# Altium footprint library Transformers.PcbLib: 93 footprints (part 6 of 7) (continued)
## TVI-180 - ER38.1/16/25 [mm]
pads (12):
  oval 3.5x2 hole 1.5: 1(-20,10) 2(-20,6) 3(-20,2) 4(-20,-2) 5(-20,-6) 6(-20,-10)
  round 2.5 hole 1.5: 1(20.5,10) 2(20.5,6) 3(20.5,2) 4(20.5,-2) 5(20.5,-6.5) 6(20.5,-10)
Mechanical 2:
  circle w0.15: c0,0 r7.2
  lines w0.15: -22,-0.5 -22,12.103 -12.501,12.103 -11.15,12.103 ccw(c-11.15,12.771) -10.679,12.299 -10.562,12.416 cw(c0,0) 0.251,16.298 ; -22,0.5 -22,-12.103 -12.501,-12.103 -11.15,-12.103 cw(c-11.15,-12.771) -10.679,-12.299 -10.562,-12.416 ccw(c0,0) 0.251,-16.298 ; -0.251,-16.298 ccw(c0,0) 10.562,-12.415 10.679,-12.299 ; -0.251,16.298 cw(c0,0) 10.562,12.415 10.679,12.299 ; 22,-0.5 22,12.103 12.501,12.103 ; 22,0.5 22,-12.103 12.501,-12.103 ; 10.679,-12.299 cw(c11.15,-12.771) 11.15,-12.103 ; 10.679,-12.299 cw(c11.15,-12.771) 11.15,-12.103 ; 10.679,12.299 ccw(c11.15,12.771) 11.15,12.103 ; 10.679,12.299 ccw(c11.15,12.771) 11.15,12.103 ; 11.15,-12.103 12.501,-12.103 ; 11.15,-12.103 12.501,-12.103 ; 11.15,12.103 12.501,12.103 ; 11.15,12.103 12.501,12.103
Top Assembly:
  circle w0.15: c0,0 r7.2
  lines w0.15: -0.251,16.298 cw(c0,0) 10.561,12.416 10.678,12.299 ccw(c11.15,12.771) 11.15,12.103 12.5,12.103 ccw(c12.5,12.603) 13,12.603 13,19 ccw(c12.5,19) 12.5,19.5 -12.5,19.5 ccw(c-12.5,19) -13,19 -13,12.603 ccw(c-12.5,12.603) -12.5,12.103 -11.15,12.103 ccw(c-11.15,12.771) -10.679,12.299 -10.562,12.416 cw(c0,0) 0.251,16.298 ; -13,-19 ccw(c-12.5,-19) -12.5,-19.5 ; -13,-19 ccw(c-12.5,-19) -12.5,-19.5 ; -13,-19 -13,-12.603 ; -13,-19 -13,-12.603 ; -13,-12.603 cw(c-12.5,-12.603) -12.5,-12.103 ; -13,-12.603 cw(c-12.5,-12.603) -12.5,-12.103 ; -12.5,-19.5 12.5,-19.5 ; -12.5,-19.5 12.5,-19.5 ; -12.5,-12.103 -11.15,-12.103 ; -12.5,-12.103 -11.15,-12.103 ; -11.15,-12.103 cw(c-11.15,-12.771) -10.679,-12.299 ; -11.15,-12.103 cw(c-11.15,-12.771) -10.679,-12.299 ; -10.679,-12.299 -10.562,-12.416 ; -10.679,-12.299 -10.562,-12.416 ; -10.561,-12.416 ccw(c0,0) 0.251,-16.298 cw(c0,0) -10.561,-12.416 ; 10.561,-12.416 cw(c0,0) -0.251,-16.298 ccw(c0,0) 10.561,-12.416 ; 10.561,-12.416 10.678,-12.299 ; 10.561,-12.416 10.678,-12.299 ; 10.678,-12.299 cw(c11.15,-12.771) 11.15,-12.103 ; 10.678,-12.299 cw(c11.15,-12.771) 11.15,-12.103 ; 11.15,-12.103 12.5,-12.103 ; 11.15,-12.103 12.5,-12.103 ; 12.5,-19.5 ccw(c12.5,-19) 13,-19 ; 12.5,-19.5 ccw(c12.5,-19) 13,-19 ; 12.5,-12.103 cw(c12.5,-12.603) 13,-12.603 ; 12.5,-12.103 cw(c12.5,-12.603) 13,-12.603 ; 13,-19 13,-12.603 ; 13,-19 13,-12.603
3D body: height 13, standoff 3, extent -22,-0.1 22,16.3
3D body: height 13, standoff 3, extent -22,-16.3 22,0.1
3D body "ER38.1-16-25.STEP": height -1, standoff -9, extent -12.7,-19.05 12.7,19.05
3D body "ER38.1-16-25.STEP": height -9, standoff -17, extent -12.7,-19.05 12.7,19.05

## TVI-180 - ER38.1/16/25 - PRIM1 [mm]
pads (12):
  oval 3.5x2 hole 1.5: 1(-20,10) 2(-20,6) 3(-20,2) 4(-20,-2) 5(-20,-6) 6(-20,-10)
  round 2.5 hole 1.5: 1(20.5,10) 2(20.5,6) 3(20.5,2) 4(20.5,-2) 5(20.5,-6.5) 6(20.5,-10)
via -9.41,-0.8 diameter 0.8 hole 0.5
via -9.41,0 diameter 0.8 hole 0.5
via -9.41,0.8 diameter 0.8 hole 0.5
Top Layer:
  lines w1.3: -19.5,10 -9.875,10 ; -14.05,0.658 -14.05,0 ccw(c0,0) 0,-14.05 ccw(c0,0) 14.05,0 ccw(c0,0) -9.86,10.009 ; -14.049,0.659 cw(c-8.829,0.659) -11.382,5.212 ; -12.5,0.658 -12.5,0 ccw(c0,0) 0,-12.5 ccw(c0,0) 12.5,0 ccw(c0,0) -11.329,5.282 ; -12.499,0.659 cw(c-8.829,0.659) -10.265,4.036 ; -10.929,0.659 cw(c-8.829,0.659) -9.012,2.751 ; -10.927,0.716 ccw(c0,0) 0,-10.95 ccw(c0,0) 10.95,0 ccw(c0,0) -10.167,4.067 ; -9.382,0.586 ccw(c0,0) 0,-9.4 ccw(c0,0) 9.4,0 ccw(c0,0) -8.99,2.746
  text "1" at -18,11 h1.5
Bottom Layer:
  region: -9.3,0.4
  lines w1.3: -19.904,6 cw(c-19.869,1.73) -15.599,1.73 ; -15.599,1.776 -15.599,-0.659 ccw(c-8.829,-0.659) -12.591,-6.287 ; -14.05,-0.658 -14.05,0 cw(c0,0) 0,14.05 cw(c0,0) 14.05,0 cw(c0,0) -12.527,-6.363 ; -14.049,-0.659 ccw(c-8.829,-0.659) -11.382,-5.212 ; -12.499,-0.659 ccw(c-8.829,-0.659) -10.265,-4.036 ; -12.5,-0.658 -12.5,0 cw(c0,0) 0,12.5 cw(c0,0) 12.5,0 cw(c0,0) -11.329,-5.282 ; -10.929,-0.659 ccw(c-8.829,-0.659) -9.012,-2.751 ; -10.927,-0.716 cw(c0,0) 0,10.95 cw(c0,0) 10.95,0 cw(c0,0) -10.167,-4.067 ; -9.382,-0.586 cw(c0,0) 0,9.4 cw(c0,0) 9.4,0 cw(c0,0) -8.99,-2.746
Keep-Out Layer:
  drawing of 3 lines, arcs and shapes, not listed
Mechanical 2:
  circle w0.15: c0,0 r7.2
  lines w0.15: -22,-0.5 -22,12.103 -12.501,12.103 -11.15,12.103 ccw(c-11.15,12.771) -10.679,12.299 -10.562,12.416 cw(c0,0) 0.251,16.298 ; -22,0.5 -22,-12.103 -12.501,-12.103 -11.15,-12.103 cw(c-11.15,-12.771) -10.679,-12.299 -10.562,-12.416 ccw(c0,0) 0.251,-16.298 ; -0.251,-16.298 ccw(c0,0) 10.562,-12.415 10.679,-12.299 ; -0.251,16.298 cw(c0,0) 10.562,12.415 10.679,12.299 ; 22,-0.5 22,12.103 12.501,12.103 ; 22,0.5 22,-12.103 12.501,-12.103 ; 10.679,-12.299 cw(c11.15,-12.771) 11.15,-12.103 ; 10.679,-12.299 cw(c11.15,-12.771) 11.15,-12.103 ; 10.679,12.299 ccw(c11.15,12.771) 11.15,12.103 ; 10.679,12.299 ccw(c11.15,12.771) 11.15,12.103 ; 11.15,-12.103 12.501,-12.103 ; 11.15,-12.103 12.501,-12.103 ; 11.15,12.103 12.501,12.103 ; 11.15,12.103 12.501,12.103
Top Assembly:
  circle w0.15: c0,0 r7.2
  lines w0.15: -0.251,16.298 cw(c0,0) 10.561,12.416 10.678,12.299 ccw(c11.15,12.771) 11.15,12.103 12.5,12.103 ccw(c12.5,12.603) 13,12.603 13,19 ccw(c12.5,19) 12.5,19.5 -12.5,19.5 ccw(c-12.5,19) -13,19 -13,12.603 ccw(c-12.5,12.603) -12.5,12.103 -11.15,12.103 ccw(c-11.15,12.771) -10.679,12.299 -10.562,12.416 cw(c0,0) 0.251,16.298 ; -13,-19 ccw(c-12.5,-19) -12.5,-19.5 ; -13,-19 ccw(c-12.5,-19) -12.5,-19.5 ; -13,-19 -13,-12.603 ; -13,-19 -13,-12.603 ; -13,-12.603 cw(c-12.5,-12.603) -12.5,-12.103 ; -13,-12.603 cw(c-12.5,-12.603) -12.5,-12.103 ; -12.5,-19.5 12.5,-19.5 ; -12.5,-19.5 12.5,-19.5 ; -12.5,-12.103 -11.15,-12.103 ; -12.5,-12.103 -11.15,-12.103 ; -11.15,-12.103 cw(c-11.15,-12.771) -10.679,-12.299 ; -11.15,-12.103 cw(c-11.15,-12.771) -10.679,-12.299 ; -10.679,-12.299 -10.562,-12.416 ; -10.679,-12.299 -10.562,-12.416 ; -10.561,-12.416 ccw(c0,0) 0.251,-16.298 cw(c0,0) -10.561,-12.416 ; 10.561,-12.416 cw(c0,0) -0.251,-16.298 ccw(c0,0) 10.561,-12.416 ; 10.561,-12.416 10.678,-12.299 ; 10.561,-12.416 10.678,-12.299 ; 10.678,-12.299 cw(c11.15,-12.771) 11.15,-12.103 ; 10.678,-12.299 cw(c11.15,-12.771) 11.15,-12.103 ; 11.15,-12.103 12.5,-12.103 ; 11.15,-12.103 12.5,-12.103 ; 12.5,-19.5 ccw(c12.5,-19) 13,-19 ; 12.5,-19.5 ccw(c12.5,-19) 13,-19 ; 12.5,-12.103 cw(c12.5,-12.603) 13,-12.603 ; 12.5,-12.103 cw(c12.5,-12.603) 13,-12.603 ; 13,-19 13,-12.603 ; 13,-19 13,-12.603
3D body "ER38.1-16-25.STEP": height 5, standoff -3, extent -12.7,-19.05 12.7,19.05

## TVI-180 - ER38.1/16/25 - PRIM2 [mm]
pads (12):
  oval 3.5x2 hole 1.5: 1(-20,10) 2(-20,6) 3(-20,2) 4(-20,-2) 5(-20,-6) 6(-20,-10)
  round 2.5 hole 1.5: 1(20.5,10) 2(20.5,6) 3(20.5,2) 4(20.5,-2) 5(20.5,-6.5) 6(20.5,-10)
via -9.41,0.8 diameter 0.8 hole 0.5
via -9.41,0 diameter 0.8 hole 0.5
via -9.41,-0.8 diameter 0.8 hole 0.5
Top Layer:
  lines w1.3: -20.5,6 -20.194,6.306 -12.555,6.306 cw(c0,0) 14.05,0 cw(c0,0) 0,-14.05 cw(c0,0) -14.05,0 -14.05,0.658 ; -14.049,0.659 cw(c-8.829,0.659) -11.382,5.212 ; -12.5,0.658 -12.5,0 ccw(c0,0) 0,-12.5 ccw(c0,0) 12.5,0 ccw(c0,0) -11.329,5.282 ; -12.499,0.659 cw(c-8.829,0.659) -10.265,4.036 ; -10.929,0.659 cw(c-8.829,0.659) -9.012,2.751 ; -10.927,0.716 ccw(c0,0) 0,-10.95 ccw(c0,0) 10.95,0 ccw(c0,0) -10.167,4.067 ; -9.382,0.586 ccw(c0,0) 0,-9.4 ccw(c0,0) 9.4,0 ccw(c0,0) -8.99,2.746
  text "2" at -18,11 h1.5
Bottom Layer:
  region: -9.3,0.4
  lines w1.3: -20.5,2 -19.569,2 cw(c-19.569,-1.066) -17.401,1.102 -16.35,0.051 cw(c-18.4,-2) -15.543,-1.504 ; -15.546,-1.505 ccw(c-8.829,-0.659) -12.591,-6.287 ; -14.05,-0.658 -14.05,0 cw(c0,0) 0,14.05 cw(c0,0) 14.05,0 cw(c0,0) -12.527,-6.363 ; -14.049,-0.659 ccw(c-8.829,-0.659) -11.382,-5.212 ; -12.499,-0.659 ccw(c-8.829,-0.659) -10.265,-4.036 ; -12.5,-0.658 -12.5,0 cw(c0,0) 0,12.5 cw(c0,0) 12.5,0 cw(c0,0) -11.329,-5.282 ; -10.929,-0.659 ccw(c-8.829,-0.659) -9.012,-2.751 ; -10.927,-0.716 cw(c0,0) 0,10.95 cw(c0,0) 10.95,0 cw(c0,0) -10.167,-4.067 ; -9.382,-0.586 cw(c0,0) 0,9.4 cw(c0,0) 9.4,0 cw(c0,0) -8.99,-2.746
Keep-Out Layer:
  drawing of 3 lines, arcs and shapes, not listed
Mechanical 2:
  circle w0.15: c0,0 r7.2
  lines w0.15: -22,-0.5 -22,12.103 -12.501,12.103 -11.15,12.103 ccw(c-11.15,12.771) -10.679,12.299 -10.562,12.416 cw(c0,0) 0.251,16.298 ; -22,0.5 -22,-12.103 -12.501,-12.103 -11.15,-12.103 cw(c-11.15,-12.771) -10.679,-12.299 -10.562,-12.416 ccw(c0,0) 0.251,-16.298 ; -0.251,-16.298 ccw(c0,0) 10.562,-12.415 10.679,-12.299 ; -0.251,16.298 cw(c0,0) 10.562,12.415 10.679,12.299 ; 22,-0.5 22,12.103 12.501,12.103 ; 22,0.5 22,-12.103 12.501,-12.103 ; 10.679,-12.299 cw(c11.15,-12.771) 11.15,-12.103 ; 10.679,-12.299 cw(c11.15,-12.771) 11.15,-12.103 ; 10.679,12.299 ccw(c11.15,12.771) 11.15,12.103 ; 10.679,12.299 ccw(c11.15,12.771) 11.15,12.103 ; 11.15,-12.103 12.501,-12.103 ; 11.15,-12.103 12.501,-12.103 ; 11.15,12.103 12.501,12.103 ; 11.15,12.103 12.501,12.103
Top Assembly:
  circle w0.15: c0,0 r7.2
  lines w0.15: -0.251,16.298 cw(c0,0) 10.561,12.416 10.678,12.299 ccw(c11.15,12.771) 11.15,12.103 12.5,12.103 ccw(c12.5,12.603) 13,12.603 13,19 ccw(c12.5,19) 12.5,19.5 -12.5,19.5 ccw(c-12.5,19) -13,19 -13,12.603 ccw(c-12.5,12.603) -12.5,12.103 -11.15,12.103 ccw(c-11.15,12.771) -10.679,12.299 -10.562,12.416 cw(c0,0) 0.251,16.298 ; -13,-19 ccw(c-12.5,-19) -12.5,-19.5 ; -13,-19 ccw(c-12.5,-19) -12.5,-19.5 ; -13,-19 -13,-12.603 ; -13,-19 -13,-12.603 ; -13,-12.603 cw(c-12.5,-12.603) -12.5,-12.103 ; -13,-12.603 cw(c-12.5,-12.603) -12.5,-12.103 ; -12.5,-19.5 12.5,-19.5 ; -12.5,-19.5 12.5,-19.5 ; -12.5,-12.103 -11.15,-12.103 ; -12.5,-12.103 -11.15,-12.103 ; -11.15,-12.103 cw(c-11.15,-12.771) -10.679,-12.299 ; -11.15,-12.103 cw(c-11.15,-12.771) -10.679,-12.299 ; -10.679,-12.299 -10.562,-12.416 ; -10.679,-12.299 -10.562,-12.416 ; -10.561,-12.416 ccw(c0,0) 0.251,-16.298 cw(c0,0) -10.561,-12.416 ; 10.561,-12.416 cw(c0,0) -0.251,-16.298 ccw(c0,0) 10.561,-12.416 ; 10.561,-12.416 10.678,-12.299 ; 10.561,-12.416 10.678,-12.299 ; 10.678,-12.299 cw(c11.15,-12.771) 11.15,-12.103 ; 10.678,-12.299 cw(c11.15,-12.771) 11.15,-12.103 ; 11.15,-12.103 12.5,-12.103 ; 11.15,-12.103 12.5,-12.103 ; 12.5,-19.5 ccw(c12.5,-19) 13,-19 ; 12.5,-19.5 ccw(c12.5,-19) 13,-19 ; 12.5,-12.103 cw(c12.5,-12.603) 13,-12.603 ; 12.5,-12.103 cw(c12.5,-12.603) 13,-12.603 ; 13,-19 13,-12.603 ; 13,-19 13,-12.603
3D body "ER38.1-16-25.STEP": height 5, standoff -3, extent -12.7,-19.05 12.7,19.05

## TVI-180 - ER38.1/16/25 - PRIM3 [mm]
pads (12):
  oval 3.5x2 hole 1.5: 1(-20,10) 2(-20,6) 3(-20,2) 4(-20,-2) 5(-20,-6) 6(-20,-10)
  round 2.5 hole 1.5: 1(20.5,10) 2(20.5,6) 3(20.5,2) 4(20.5,-2) 5(20.5,-6.5) 6(20.5,-10)
via -9.41,-0.8 diameter 0.8 hole 0.5
via -9.41,0 diameter 0.8 hole 0.5
via -9.41,0.8 diameter 0.8 hole 0.5
Top Layer:
  lines w1.3: -20.5,2 -17,2 -14.25,4.75 ; -14.091,4.919 cw(c-8.829,0.659) -12.55,6.315 ; -14.05,0.658 -14.05,0 ccw(c0,0) 0,-14.05 ccw(c0,0) 14.05,0 ccw(c0,0) -12.551,6.316 ; -14.049,0.659 cw(c-8.829,0.659) -11.382,5.212 ; -12.5,0.658 -12.5,0 ccw(c0,0) 0,-12.5 ccw(c0,0) 12.5,0 ccw(c0,0) -11.329,5.282 ; -12.499,0.659 cw(c-8.829,0.659) -10.265,4.036 ; -10.929,0.659 cw(c-8.829,0.659) -9.012,2.751 ; -10.927,0.716 ccw(c0,0) 0,-10.95 ccw(c0,0) 10.95,0 ccw(c0,0) -10.167,4.067 ; -9.382,0.586 ccw(c0,0) 0,-9.4 ccw(c0,0) 9.4,0 ccw(c0,0) -8.99,2.746
  text "3" at -18,11 h1.5
Bottom Layer:
  region: -9.3,0.4
  lines w1.3: -20.5,-2 -17,-2 -14.25,-4.75 ; -14.091,-4.919 ccw(c-8.829,-0.659) -12.55,-6.315 ; -14.05,-0.658 -14.05,0 cw(c0,0) 0,14.05 cw(c0,0) 14.05,0 cw(c0,0) -12.527,-6.363 ; -14.049,-0.659 ccw(c-8.829,-0.659) -11.382,-5.212 ; -12.499,-0.659 ccw(c-8.829,-0.659) -10.265,-4.036 ; -12.5,-0.658 -12.5,0 cw(c0,0) 0,12.5 cw(c0,0) 12.5,0 cw(c0,0) -11.329,-5.282 ; -10.929,-0.659 ccw(c-8.829,-0.659) -9.012,-2.751 ; -10.927,-0.716 cw(c0,0) 0,10.95 cw(c0,0) 10.95,0 cw(c0,0) -10.167,-4.067 ; -9.382,-0.586 cw(c0,0) 0,9.4 cw(c0,0) 9.4,0 cw(c0,0) -8.99,-2.746
Keep-Out Layer:
  drawing of 3 lines, arcs and shapes, not listed
Mechanical 2:
  circle w0.15: c0,0 r7.2
  lines w0.15: -22,-0.5 -22,12.103 -12.501,12.103 -11.15,12.103 ccw(c-11.15,12.771) -10.679,12.299 -10.562,12.416 cw(c0,0) 0.251,16.298 ; -22,0.5 -22,-12.103 -12.501,-12.103 -11.15,-12.103 cw(c-11.15,-12.771) -10.679,-12.299 -10.562,-12.416 ccw(c0,0) 0.251,-16.298 ; -0.251,-16.298 ccw(c0,0) 10.562,-12.415 10.679,-12.299 ; -0.251,16.298 cw(c0,0) 10.562,12.415 10.679,12.299 ; 22,-0.5 22,12.103 12.501,12.103 ; 22,0.5 22,-12.103 12.501,-12.103 ; 10.679,-12.299 cw(c11.15,-12.771) 11.15,-12.103 ; 10.679,-12.299 cw(c11.15,-12.771) 11.15,-12.103 ; 10.679,12.299 ccw(c11.15,12.771) 11.15,12.103 ; 10.679,12.299 ccw(c11.15,12.771) 11.15,12.103 ; 11.15,-12.103 12.501,-12.103 ; 11.15,-12.103 12.501,-12.103 ; 11.15,12.103 12.501,12.103 ; 11.15,12.103 12.501,12.103
Top Assembly:
  circle w0.15: c0,0 r7.2
  lines w0.15: -0.251,16.298 cw(c0,0) 10.561,12.416 10.678,12.299 ccw(c11.15,12.771) 11.15,12.103 12.5,12.103 ccw(c12.5,12.603) 13,12.603 13,19 ccw(c12.5,19) 12.5,19.5 -12.5,19.5 ccw(c-12.5,19) -13,19 -13,12.603 ccw(c-12.5,12.603) -12.5,12.103 -11.15,12.103 ccw(c-11.15,12.771) -10.679,12.299 -10.562,12.416 cw(c0,0) 0.251,16.298 ; -13,-19 ccw(c-12.5,-19) -12.5,-19.5 ; -13,-19 ccw(c-12.5,-19) -12.5,-19.5 ; -13,-19 -13,-12.603 ; -13,-19 -13,-12.603 ; -13,-12.603 cw(c-12.5,-12.603) -12.5,-12.103 ; -13,-12.603 cw(c-12.5,-12.603) -12.5,-12.103 ; -12.5,-19.5 12.5,-19.5 ; -12.5,-19.5 12.5,-19.5 ; -12.5,-12.103 -11.15,-12.103 ; -12.5,-12.103 -11.15,-12.103 ; -11.15,-12.103 cw(c-11.15,-12.771) -10.679,-12.299 ; -11.15,-12.103 cw(c-11.15,-12.771) -10.679,-12.299 ; -10.679,-12.299 -10.562,-12.416 ; -10.679,-12.299 -10.562,-12.416 ; -10.561,-12.416 ccw(c0,0) 0.251,-16.298 cw(c0,0) -10.561,-12.416 ; 10.561,-12.416 cw(c0,0) -0.251,-16.298 ccw(c0,0) 10.561,-12.416 ; 10.561,-12.416 10.678,-12.299 ; 10.561,-12.416 10.678,-12.299 ; 10.678,-12.299 cw(c11.15,-12.771) 11.15,-12.103 ; 10.678,-12.299 cw(c11.15,-12.771) 11.15,-12.103 ; 11.15,-12.103 12.5,-12.103 ; 11.15,-12.103 12.5,-12.103 ; 12.5,-19.5 ccw(c12.5,-19) 13,-19 ; 12.5,-19.5 ccw(c12.5,-19) 13,-19 ; 12.5,-12.103 cw(c12.5,-12.603) 13,-12.603 ; 12.5,-12.103 cw(c12.5,-12.603) 13,-12.603 ; 13,-19 13,-12.603 ; 13,-19 13,-12.603
3D body "ER38.1-16-25.STEP": height 5, standoff -3, extent -12.7,-19.05 12.7,19.05

## TVI-180 - ER38.1/16/25 - PRIM4 [mm]
pads (12):
  oval 3.5x2 hole 1.5: 1(-20,10) 2(-20,6) 3(-20,2) 4(-20,-2) 5(-20,-6) 6(-20,-10)
  round 2.5 hole 1.5: 1(20.5,10) 2(20.5,6) 3(20.5,2) 4(20.5,-2) 5(20.5,-6.5) 6(20.5,-10)
via -9.75,0 diameter 0.8 hole 0.5
Top Layer:
  region: -9.5,1.25
  region: -9.3,-2.4 -9.25,0.25 -9.5,0.5 -10,0.5 -10.2,0.3 -10.2,-0.1
  lines w0.7: -20.256,-5.994 -17,-5.994 ccw(c-17,-2.644) -13.65,-2.644 -13.65,0 cw(c-0.95,0) -0.95,12.7 ; -9.85,0 ccw(c0,0) 0,-9.85 ccw(c0,0) 9.85,0 ccw(c0,0) 0,9.85 -0.95,9.85 ccw(c-0.95,0) -10.8,0 ccw(c0,0) 0,-10.8 ccw(c0,0) 10.8,0 ccw(c0,0) 0,10.8 -0.95,10.8 ccw(c-0.95,0) -11.75,0 ccw(c0,0) 0,-11.75 ccw(c0,0) 11.75,0 ccw(c0,0) 0,11.75 -0.95,11.75 ccw(c-0.95,0) -12.7,0 ccw(c0,0) 0,-12.7 ccw(c0,0) 12.7,0 ccw(c0,0) 0,12.7 ; -0.966,12.7 -0.016,12.7
  lines w1.3: -20.194,6.306 -20,6
  text "4" at -18,11 h1.5
Bottom Layer:
  region: -9.3,0.4
  region: -10,2
  region: -10.5,-0.19 -10.467,0.305 -10.33,1.288 -10.096,2.253 -9.769,3.19 -9.352,4.091 -8.849,4.946 -8.264,5.748 -7.603,6.489 -6.873,7.161 -6.081,7.759 -5.233,8.276 -4.34,8.707 -3.408,9.049 -2.447,9.298 -1.466,9.452 -0.475,9.508 0.021,9.5 0.491,9.483 1.426,9.381 2.347,9.187 3.244,8.904 4.109,8.535 4.933,8.082 5.71,7.551 6.43,6.946 7.088,6.274 7.677,5.54 8.191,4.753 8.625,3.918 8.975,3.045 9.238,2.142 9.412,1.218 9.494,0.281 9.5,-0.19 13.021,-0.19 13.041,0.341 12.997,1.401 12.869,2.455 12.66,3.496 12.37,4.517 12,5.512 11.553,6.475 11.033,7.4 10.441,8.281 9.782,9.114 9.059,9.892 8.278,10.61 7.443,11.266 6.559,11.853 5.632,12.37 4.667,12.812 3.67,13.178 2.648,13.463 1.606,13.668 0.551,13.791 0.021,13.81 -0.529,13.81 -1.626,13.724 -2.712,13.552 -3.782,13.295 -4.828,12.955 -5.845,12.534 -6.825,12.035 -7.763,11.46 -8.653,10.813 -9.49,10.099 -10.267,9.321 -10.982,8.484 -11.629,7.594 -12.203,6.656 -12.703,5.676 -13.124,4.66 -13.464,3.613 -13.721,2.544 -13.893,1.457 -13.979,0.36 -13.979,-0.19
  region: -5.709,-8 -5.385,-8.191 -4.719,-8.538 -4.028,-8.833 -3.318,-9.077 -2.591,-9.267 -1.852,-9.403 -1.105,-9.484 -0.355,-9.508 0.021,-9.5 0.491,-9.483 1.426,-9.381 2.347,-9.187 3.244,-8.904 4.109,-8.535 4.933,-8.082 5.71,-7.551 6.43,-6.946 7.088,-6.274 7.677,-5.54 8.191,-4.753 8.625,-3.918 8.975,-3.045 9.238,-2.142 9.412,-1.218 9.494,-0.281 9.5,0.19 13.021,0.19 13.041,-0.341 12.997,-1.401 12.869,-2.455 12.66,-3.496 12.37,-4.517 12,-5.512 11.553,-6.475 11.033,-7.4 10.441,-8.281 9.782,-9.114 9.059,-9.892 8.278,-10.61 7.443,-11.266 6.559,-11.853 5.632,-12.37 4.667,-12.812 3.67,-13.178 2.648,-13.463 1.606,-13.668 0.551,-13.791 0.021,-13.81 -0.531,-13.81 -1.632,-13.723 -2.722,-13.55 -3.796,-13.291 -4.845,-12.949 -5.865,-12.525 -6.848,-12.022 -7.788,-11.443 -8.68,-10.792 -9.518,-10.073 -10.296,-9.29 -11.011,-8.448 -11.334,-8
  region: -18.6,-9.425 -18.194,-9.194 -17.422,-8.671 -16.708,-8.07 -16.061,-7.398 -15.488,-6.662 -14.994,-5.87 -14.585,-5.031 -14.267,-4.154 -14.041,-3.249 -13.911,-2.325 -13.878,-1.392 -13.942,-0.462 -14.011,0 -10.489,0 -10.533,-0.483 -10.703,-1.439 -10.953,-2.377 -11.282,-3.29 -11.688,-4.172 -12.168,-5.017 -12.717,-5.817 -13.333,-6.567 -14.01,-7.263 -14.744,-7.898 -15.53,-8.469 -16.361,-8.97 -17.232,-9.399 -18.136,-9.753 -19.067,-10.028 -20.018,-10.222 -20.5,-10.279
  lines w0.7: -20,-10 -18.081,-10 ccw(c-18.081,-1.669) -9.75,-1.669 -9.75,0
Keep-Out Layer:
  drawing of 3 lines, arcs and shapes, not listed
Mechanical 2:
  circle w0.15: c0,0 r7.2
  lines w0.15: -22,-0.5 -22,12.103 -12.501,12.103 -11.15,12.103 ccw(c-11.15,12.771) -10.679,12.299 -10.562,12.416 cw(c0,0) 0.251,16.298 ; -22,0.5 -22,-12.103 -12.501,-12.103 -11.15,-12.103 cw(c-11.15,-12.771) -10.679,-12.299 -10.562,-12.416 ccw(c0,0) 0.251,-16.298 ; -0.251,-16.298 ccw(c0,0) 10.562,-12.415 10.679,-12.299 ; -0.251,16.298 cw(c0,0) 10.562,12.415 10.679,12.299 ; 22,-0.5 22,12.103 12.501,12.103 ; 22,0.5 22,-12.103 12.501,-12.103 ; 10.679,-12.299 cw(c11.15,-12.771) 11.15,-12.103 ; 10.679,-12.299 cw(c11.15,-12.771) 11.15,-12.103 ; 10.679,12.299 ccw(c11.15,12.771) 11.15,12.103 ; 10.679,12.299 ccw(c11.15,12.771) 11.15,12.103 ; 11.15,-12.103 12.501,-12.103 ; 11.15,-12.103 12.501,-12.103 ; 11.15,12.103 12.501,12.103 ; 11.15,12.103 12.501,12.103
Top Assembly:
  circle w0.15: c0,0 r7.2
  lines w0.15: -0.251,16.298 cw(c0,0) 10.561,12.416 10.678,12.299 ccw(c11.15,12.771) 11.15,12.103 12.5,12.103 ccw(c12.5,12.603) 13,12.603 13,19 ccw(c12.5,19) 12.5,19.5 -12.5,19.5 ccw(c-12.5,19) -13,19 -13,12.603 ccw(c-12.5,12.603) -12.5,12.103 -11.15,12.103 ccw(c-11.15,12.771) -10.679,12.299 -10.562,12.416 cw(c0,0) 0.251,16.298 ; -13,-19 ccw(c-12.5,-19) -12.5,-19.5 ; -13,-19 ccw(c-12.5,-19) -12.5,-19.5 ; -13,-19 -13,-12.603 ; -13,-19 -13,-12.603 ; -13,-12.603 cw(c-12.5,-12.603) -12.5,-12.103 ; -13,-12.603 cw(c-12.5,-12.603) -12.5,-12.103 ; -12.5,-19.5 12.5,-19.5 ; -12.5,-19.5 12.5,-19.5 ; -12.5,-12.103 -11.15,-12.103 ; -12.5,-12.103 -11.15,-12.103 ; -11.15,-12.103 cw(c-11.15,-12.771) -10.679,-12.299 ; -11.15,-12.103 cw(c-11.15,-12.771) -10.679,-12.299 ; -10.679,-12.299 -10.562,-12.416 ; -10.679,-12.299 -10.562,-12.416 ; -10.561,-12.416 ccw(c0,0) 0.251,-16.298 cw(c0,0) -10.561,-12.416 ; 10.561,-12.416 cw(c0,0) -0.251,-16.298 ccw(c0,0) 10.561,-12.416 ; 10.561,-12.416 10.678,-12.299 ; 10.561,-12.416 10.678,-12.299 ; 10.678,-12.299 cw(c11.15,-12.771) 11.15,-12.103 ; 10.678,-12.299 cw(c11.15,-12.771) 11.15,-12.103 ; 11.15,-12.103 12.5,-12.103 ; 11.15,-12.103 12.5,-12.103 ; 12.5,-19.5 ccw(c12.5,-19) 13,-19 ; 12.5,-19.5 ccw(c12.5,-19) 13,-19 ; 12.5,-12.103 cw(c12.5,-12.603) 13,-12.603 ; 12.5,-12.103 cw(c12.5,-12.603) 13,-12.603 ; 13,-19 13,-12.603 ; 13,-19 13,-12.603
3D body "ER38.1-16-25.STEP": height 5, standoff -3, extent -12.7,-19.05 12.7,19.05

## TVI-180 - ER38.1/16/25 - SEC1 [mm]
pads (12):
  oval 3.5x2 hole 1.5: 1(-20,10) 2(-20,6) 3(-20,2) 4(-20,-2) 5(-20,-6) 6(-20,-10)
  rect 2x2.5 hole 1.5 copper offset -0.25,0: 1(20.5,10) 2(20.5,6) 3(20.5,2) 4(20.5,-2) 5(20.5,-6) 6(20.5,-10)
via 18,-9.5 diameter 0.8 hole 0.4
via 18,-7.5 diameter 0.8 hole 0.4
via 17,-8.5 diameter 0.8 hole 0.4
via 18,-3 diameter 0.8 hole 0.4
via 18,-1 diameter 0.8 hole 0.4
via 17,-2 diameter 0.8 hole 0.4
via 19.5,-3 diameter 0.8 hole 0.4
via 19.5,-1 diameter 0.8 hole 0.4
via 18.5,-2 diameter 0.8 hole 0.4
via 19.5,-9.5 diameter 0.8 hole 0.4
via 19.5,-7.5 diameter 0.8 hole 0.4
via 18.5,-8.5 diameter 0.8 hole 0.4
Top Layer:
  region: 5.532,-11.425 9.825,-11.425 13.775,-11.425 21.3,-11.425 21.3,-4.75 8.05,-4.75 3.454,-9.346
  region: 15.376,0 21.3,0 21.3,-4 8.171,-4 8.33,-3.62 8.605,-2.843 8.824,-2.049 8.983,-1.24 9.083,-0.422 9.123,0.401 9.102,1.225 9.021,2.045 8.958,2.452 11.712,3.003
  lines w1.3: -20.194,6.306 -20,6
  lines w5.5: 8.404,-8.284 cw(c0,0) 0,-11.8 cw(c0,0) -11.8,0 cw(c0,0) 0,11.8 cw(c0,0) 11.759,-0.98
  text "4" at -18,11 h1.5
Bottom Layer:
  region: 5.532,-11.425 9.825,-11.425 13.775,-11.425 21.3,-11.425 21.3,-4.75 8.05,-4.75 3.454,-9.346
  region: 15.376,0 21.3,0 21.3,-4 8.171,-4 8.33,-3.62 8.605,-2.843 8.824,-2.049 8.983,-1.24 9.083,-0.422 9.123,0.401 9.102,1.225 9.021,2.045 8.958,2.452 11.712,3.003
  lines w5.5: 8.404,-8.284 cw(c0,0) 0,-11.8 cw(c0,0) -11.8,0 cw(c0,0) 0,11.8 cw(c0,0) 11.759,-0.98
  text "6" at -18,11.75 h1.5
Keep-Out Layer:
  drawing of 3 lines, arcs and shapes, not listed
Mechanical 2:
  circle w0.15: c0,0 r7.2
  lines w0.15: -22,-0.5 -22,12.103 -12.501,12.103 -11.15,12.103 ccw(c-11.15,12.771) -10.679,12.299 -10.562,12.416 cw(c0,0) 0.251,16.298 ; -22,0.5 -22,-12.103 -12.501,-12.103 -11.15,-12.103 cw(c-11.15,-12.771) -10.679,-12.299 -10.562,-12.416 ccw(c0,0) 0.251,-16.298 ; -0.251,-16.298 ccw(c0,0) 10.562,-12.415 10.679,-12.299 ; -0.251,16.298 cw(c0,0) 10.562,12.415 10.679,12.299 ; 21.3,-0.5 21.3,12.103 12.501,12.103 ; 21.3,0.5 21.3,-12.103 12.501,-12.103 ; 10.679,-12.299 cw(c11.15,-12.771) 11.15,-12.103 ; 10.679,-12.299 cw(c11.15,-12.771) 11.15,-12.103 ; 10.679,12.299 ccw(c11.15,12.771) 11.15,12.103 ; 10.679,12.299 ccw(c11.15,12.771) 11.15,12.103 ; 11.15,-12.103 12.501,-12.103 ; 11.15,-12.103 12.501,-12.103 ; 11.15,12.103 12.501,12.103 ; 11.15,12.103 12.501,12.103
Top Assembly:
  circle w0.15: c0,0 r7.2
  lines w0.15: -0.251,16.298 cw(c0,0) 10.561,12.416 10.678,12.299 ccw(c11.15,12.771) 11.15,12.103 12.5,12.103 ccw(c12.5,12.603) 13,12.603 13,19 ccw(c12.5,19) 12.5,19.5 -12.5,19.5 ccw(c-12.5,19) -13,19 -13,12.603 ccw(c-12.5,12.603) -12.5,12.103 -11.15,12.103 ccw(c-11.15,12.771) -10.679,12.299 -10.562,12.416 cw(c0,0) 0.251,16.298 ; -13,-19 ccw(c-12.5,-19) -12.5,-19.5 ; -13,-19 ccw(c-12.5,-19) -12.5,-19.5 ; -13,-19 -13,-12.603 ; -13,-19 -13,-12.603 ; -13,-12.603 cw(c-12.5,-12.603) -12.5,-12.103 ; -13,-12.603 cw(c-12.5,-12.603) -12.5,-12.103 ; -12.5,-19.5 12.5,-19.5 ; -12.5,-19.5 12.5,-19.5 ; -12.5,-12.103 -11.15,-12.103 ; -12.5,-12.103 -11.15,-12.103 ; -11.15,-12.103 cw(c-11.15,-12.771) -10.679,-12.299 ; -11.15,-12.103 cw(c-11.15,-12.771) -10.679,-12.299 ; -10.679,-12.299 -10.562,-12.416 ; -10.679,-12.299 -10.562,-12.416 ; -10.561,-12.416 ccw(c0,0) 0.251,-16.298 cw(c0,0) -10.561,-12.416 ; 10.561,-12.416 cw(c0,0) -0.251,-16.298 ccw(c0,0) 10.561,-12.416 ; 10.561,-12.416 10.678,-12.299 ; 10.561,-12.416 10.678,-12.299 ; 10.678,-12.299 cw(c11.15,-12.771) 11.15,-12.103 ; 10.678,-12.299 cw(c11.15,-12.771) 11.15,-12.103 ; 11.15,-12.103 12.5,-12.103 ; 11.15,-12.103 12.5,-12.103 ; 12.5,-19.5 ccw(c12.5,-19) 13,-19 ; 12.5,-19.5 ccw(c12.5,-19) 13,-19 ; 12.5,-12.103 cw(c12.5,-12.603) 13,-12.603 ; 12.5,-12.103 cw(c12.5,-12.603) 13,-12.603 ; 13,-19 13,-12.603 ; 13,-19 13,-12.603
3D body "ER38.1-16-25.STEP": height 5, standoff -3, extent -12.7,-19.05 12.7,19.05

## TVI-180 - ER38.1/16/25 - SEC1 - duplicate [mm]
pads (12):
  oval 3.5x2 hole 1.5: 1(-20,10) 2(-20,6) 3(-20,2) 4(-20,-2) 5(-20,-6) 6(-20,-10)
  round 2.5 hole 1.5: 1(20.5,10) 2(20.5,6) 3(20.5,2) 4(20.5,-2) 5(20.5,-6.5) 6(20.5,-10)
Top Layer:
  lines w0.15: -0.228,-14.798 ccw(c0,0) 11.168,-9.711 15.5,-9.711 22,-9.711 22,-6.269 16.06,-6.269 6.162,-6.269 ; 0.228,-14.798 cw(c0,0) 14.763,-1.041 ; 6.162,-6.282 cw(c0,0) 7.558,-4.507 ; 7.546,-4.5 16.06,-4.5 22,-4.5 22,-1.058 15.5,-1.058 14.763,-1.058 ; 15.5,4.154 22,4.154 ; 15.5,9.365 22,9.365 ; 16.06,0.711 22,0.711 ; 16.06,5.923 22,5.923
  lines w1.3: -20.194,6.306 -20,6
  text "4" at -18,11 h1.5
Keep-Out Layer:
  drawing of 3 lines, arcs and shapes, not listed
Mechanical 2:
  circle w0.15: c0,0 r7.2
  lines w0.15: -22,-0.5 -22,12.103 -12.501,12.103 -11.15,12.103 ccw(c-11.15,12.771) -10.679,12.299 -10.562,12.416 cw(c0,0) 0.251,16.298 ; -22,0.5 -22,-12.103 -12.501,-12.103 -11.15,-12.103 cw(c-11.15,-12.771) -10.679,-12.299 -10.562,-12.416 ccw(c0,0) 0.251,-16.298 ; -0.251,-16.298 ccw(c0,0) 10.562,-12.415 10.679,-12.299 ; -0.251,16.298 cw(c0,0) 10.562,12.415 10.679,12.299 ; 22,-0.5 22,12.103 12.501,12.103 ; 22,0.5 22,-12.103 12.501,-12.103 ; 10.679,-12.299 cw(c11.15,-12.771) 11.15,-12.103 ; 10.679,-12.299 cw(c11.15,-12.771) 11.15,-12.103 ; 10.679,12.299 ccw(c11.15,12.771) 11.15,12.103 ; 10.679,12.299 ccw(c11.15,12.771) 11.15,12.103 ; 11.15,-12.103 12.501,-12.103 ; 11.15,-12.103 12.501,-12.103 ; 11.15,12.103 12.501,12.103 ; 11.15,12.103 12.501,12.103
Top Assembly:
  circle w0.15: c0,0 r7.2
  lines w0.15: -0.251,16.298 cw(c0,0) 10.561,12.416 10.678,12.299 ccw(c11.15,12.771) 11.15,12.103 12.5,12.103 ccw(c12.5,12.603) 13,12.603 13,19 ccw(c12.5,19) 12.5,19.5 -12.5,19.5 ccw(c-12.5,19) -13,19 -13,12.603 ccw(c-12.5,12.603) -12.5,12.103 -11.15,12.103 ccw(c-11.15,12.771) -10.679,12.299 -10.562,12.416 cw(c0,0) 0.251,16.298 ; -13,-19 ccw(c-12.5,-19) -12.5,-19.5 ; -13,-19 ccw(c-12.5,-19) -12.5,-19.5 ; -13,-19 -13,-12.603 ; -13,-19 -13,-12.603 ; -13,-12.603 cw(c-12.5,-12.603) -12.5,-12.103 ; -13,-12.603 cw(c-12.5,-12.603) -12.5,-12.103 ; -12.5,-19.5 12.5,-19.5 ; -12.5,-19.5 12.5,-19.5 ; -12.5,-12.103 -11.15,-12.103 ; -12.5,-12.103 -11.15,-12.103 ; -11.15,-12.103 cw(c-11.15,-12.771) -10.679,-12.299 ; -11.15,-12.103 cw(c-11.15,-12.771) -10.679,-12.299 ; -10.679,-12.299 -10.562,-12.416 ; -10.679,-12.299 -10.562,-12.416 ; -10.561,-12.416 ccw(c0,0) 0.251,-16.298 cw(c0,0) -10.561,-12.416 ; 10.561,-12.416 cw(c0,0) -0.251,-16.298 ccw(c0,0) 10.561,-12.416 ; 10.561,-12.416 10.678,-12.299 ; 10.561,-12.416 10.678,-12.299 ; 10.678,-12.299 cw(c11.15,-12.771) 11.15,-12.103 ; 10.678,-12.299 cw(c11.15,-12.771) 11.15,-12.103 ; 11.15,-12.103 12.5,-12.103 ; 11.15,-12.103 12.5,-12.103 ; 12.5,-19.5 ccw(c12.5,-19) 13,-19 ; 12.5,-19.5 ccw(c12.5,-19) 13,-19 ; 12.5,-12.103 cw(c12.5,-12.603) 13,-12.603 ; 12.5,-12.103 cw(c12.5,-12.603) 13,-12.603 ; 13,-19 13,-12.603 ; 13,-19 13,-12.603
3D body "ER38.1-16-25.STEP": height 5, standoff -3, extent -12.7,-19.05 12.7,19.05